# Altium footprint library capacitor_thd.PcbLib: 131 footprints (part 7 of 9)
Each footprint in its own frame and in the unit in brackets; x right, y up, seen from the top. Pads: shape width x height; smd on the part's side, far side on the other; paste and mask are expansions set on the pad; w line width, h text height; cw(c..) or ccw(c..) is an arc to the next point about the centre after c.
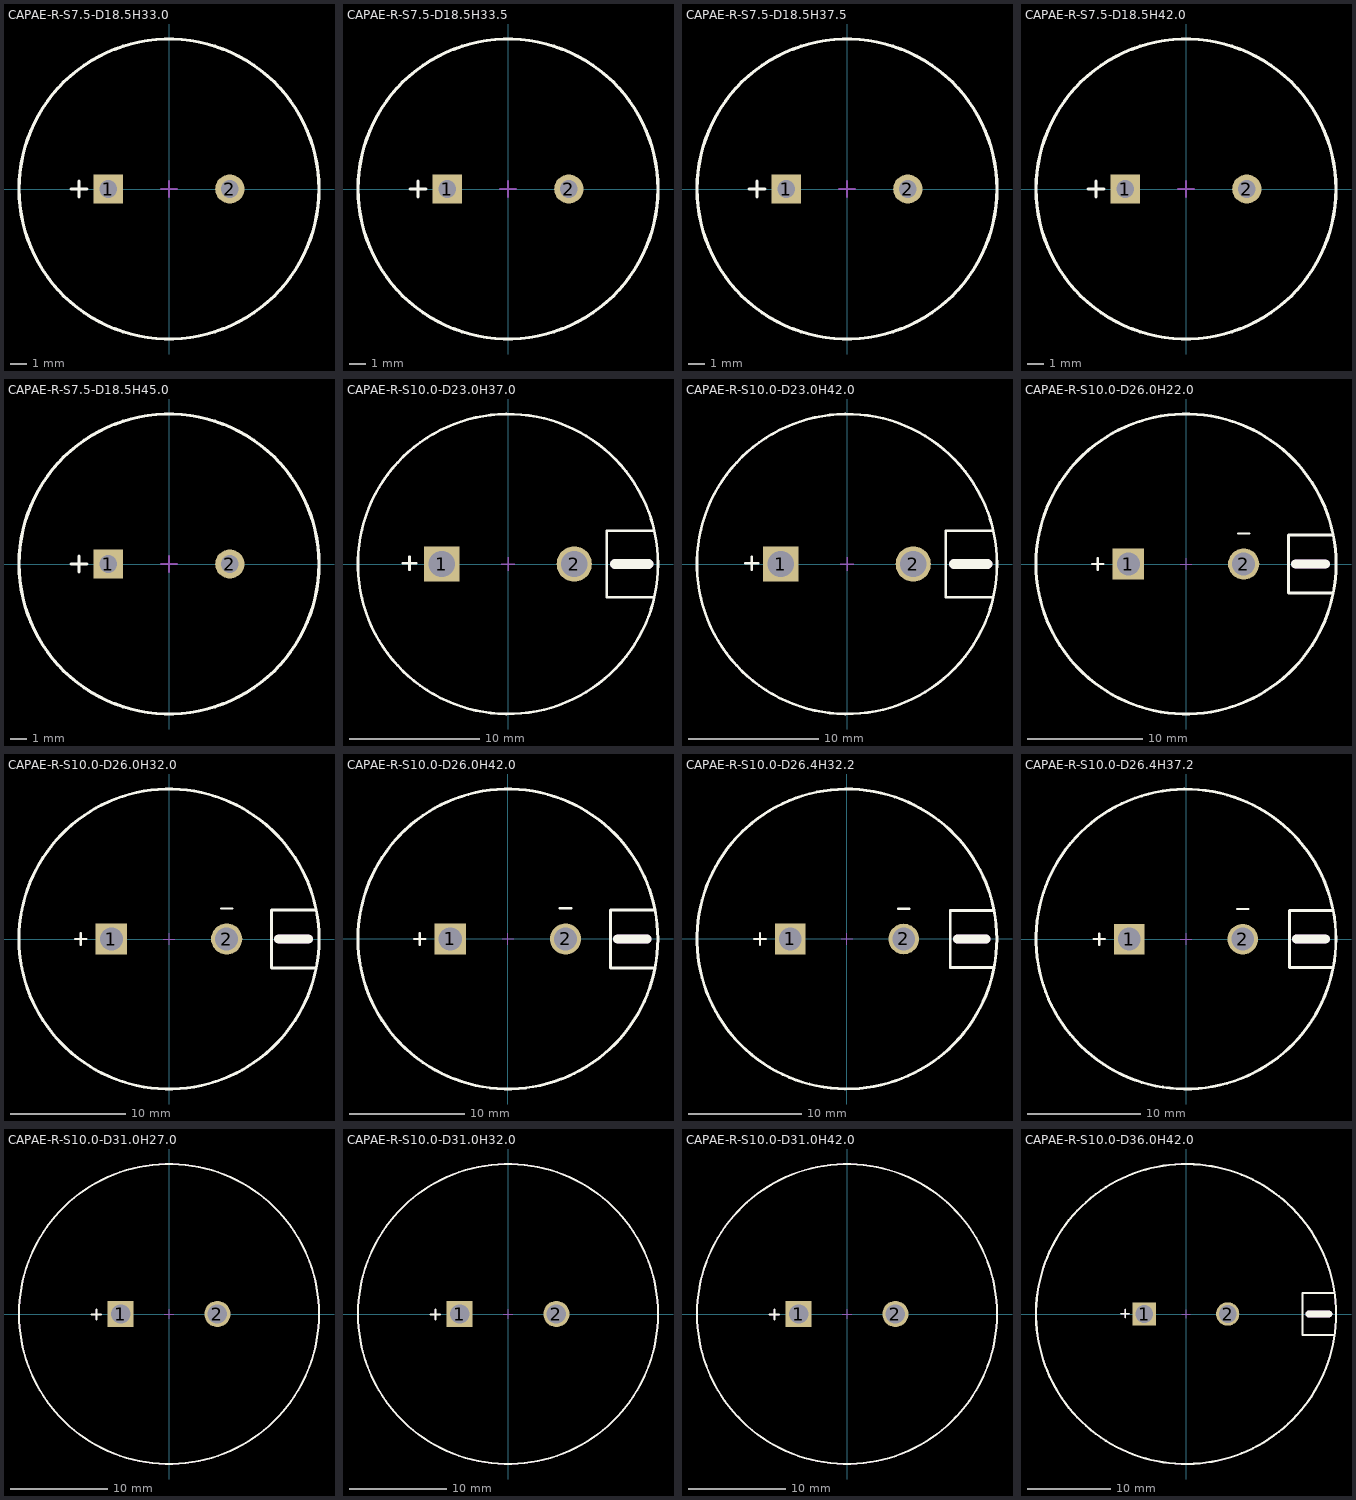
[diagram p6: the footprints below, top view; thin cyan lines are the x and y axes]

## CAPAE-R-S7.5-D18.5H33.0 [mm] "Capacitor, Radial, Pin spacing 7.5mm - Body Diameter 18.5mm X Body  Height 33.0mm"
height 33
pads (2):
  rect 1.8x1.8 hole 1.1: 1(-3.75,0)
  round 1.8 hole 1.1: 2(3.75,0)
Top Overlay:
  circle w0.2: c0,0 r9.25
  lines w0.2: -6.05,0 -5.05,0 ; -5.55,-0.5 -5.55,0.5
Mechanical 1:
  circle w0.1: c0,0 r9.25
  lines w0.1: -6.05,0 -5.05,0 ; -5.55,-0.5 -5.55,0.5
Mechanical 15:
  circle w0.1: c0,0 r9.25
  lines w0.1: -0.5,0 0.5,0 ; 0,-0.5 0,0.5
3D body "CAPPR750-1850X3300.stp": height 33, standoff -3.6, extent -9.25,-9.241 9.25,9.241

## CAPAE-R-S7.5-D18.5H33.5 [mm] "Capacitor, Radial, Pin spacing 7.5mm - Body Diameter 18.5mm X Body  Height 33.5mm"
height 33.5
pads (2):
  rect 1.8x1.8 hole 1.1: 1(-3.75,0)
  round 1.8 hole 1.1: 2(3.75,0)
Top Overlay:
  circle w0.2: c0,0 r9.25
  lines w0.2: -6.05,0 -5.05,0 ; -5.55,-0.5 -5.55,0.5
Mechanical 1:
  circle w0.1: c0,0 r9.25
  lines w0.1: -6.05,0 -5.05,0 ; -5.55,-0.5 -5.55,0.5
Mechanical 15:
  circle w0.1: c0,0 r9.25
  lines w0.1: -0.5,0 0.5,0 ; 0,-0.5 0,0.5
3D body "CAPPR750-1850X3350.stp": height 33.5, standoff -3.6, extent -9.25,-9.216 9.25,9.216

## CAPAE-R-S7.5-D18.5H37.5 [mm] "Capacitor, Radial, Pin spacing 7.5mm - Body Diameter 18.5mm X Body  Height 37.5mm"
height 37.5
pads (2):
  rect 1.8x1.8 hole 1.1: 1(-3.75,0)
  round 1.8 hole 1.1: 2(3.75,0)
Top Overlay:
  circle w0.2: c0,0 r9.25
  lines w0.2: -6.05,0 -5.05,0 ; -5.55,-0.5 -5.55,0.5
Mechanical 1:
  circle w0.1: c0,0 r9.25
  lines w0.1: -6.05,0 -5.05,0 ; -5.55,-0.5 -5.55,0.5
Mechanical 15:
  circle w0.1: c0,0 r9.25
  lines w0.1: -0.5,0 0.5,0 ; 0,-0.5 0,0.5
3D body "CAPPR750-1850X3750.stp": height 37.5, standoff -3.6, extent -9.25,-9.216 9.25,9.216

## CAPAE-R-S7.5-D18.5H42.0 [mm] "Capacitor, Radial, Pin spacing 7.5mm - Body Diameter 18.5mm X Body  Height 42mm"
height 42.5
pads (2):
  rect 1.8x1.8 hole 1.1: 1(-3.75,0)
  round 1.8 hole 1.1: 2(3.75,0)
Top Overlay:
  circle w0.2: c0,0 r9.25
  lines w0.2: -6.05,0 -5.05,0 ; -5.55,-0.5 -5.55,0.5
Mechanical 1:
  circle w0.1: c0,0 r9.25
  lines w0.1: -6.05,0 -5.05,0 ; -5.55,-0.5 -5.55,0.5
Mechanical 15:
  circle w0.1: c0,0 r9.25
  lines w0.1: -0.5,0 0.5,0 ; 0,-0.5 0,0.5
3D body "CAPPR750-1850X4200.stp": height 42, standoff -3.6, extent -9.25,-9.216 9.25,9.264

## CAPAE-R-S7.5-D18.5H45.0 [mm] "Capacitor, Radial, Pin spacing 7.5mm - Body Diameter 18.5mm X Body  Height 45mm"
height 46.5
pads (2):
  rect 1.8x1.8 hole 1.1: 1(-3.75,0)
  round 1.8 hole 1.1: 2(3.75,0)
Top Overlay:
  circle w0.2: c0,0 r9.25
  lines w0.2: -6.05,0 -5.05,0 ; -5.55,-0.5 -5.55,0.5
Mechanical 1:
  circle w0.1: c0,0 r9.25
  lines w0.1: -6.05,0 -5.05,0 ; -5.55,-0.5 -5.55,0.5
Mechanical 15:
  circle w0.1: c0,0 r9.25
  lines w0.1: -0.5,0 0.5,0 ; 0,-0.5 0,0.5
3D body "CAPPR750-1850X4650.stp": height 46.5, standoff -3.6, extent -9.25,-9.25 9.25,9.245

## CAPAE-R-S10.0-D23.0H37.0 [mm] "Capacitor, Radial, Pins spacing 10mm - Body Diameter 23mm X Body  Height 37mm"
height 37
pads (2):
  rect 2.7x2.7 hole 2: 1(-5.08,0)
  round 2.7 hole 2: 2(5.08,0)
Top Overlay:
  circle w0.2: c0,0 r11.5
  lines w0.2: -8.05,0.05 -7.05,0.05 ; -7.55,-0.45 -7.55,0.55 ; 11.131,-2.54 7.575,-2.54 7.575,2.54 11.131,2.54
  lines w0.8: 8.21,0 10.75,0
Mechanical 1:
  circle w0.1: c0,0 r11.5
  lines w0.1: -8.05,0.05 -7.05,0.05 ; -7.55,-0.45 -7.55,0.55 ; 11.131,-2.54 7.575,-2.54 7.575,2.54 11.131,2.54
  lines w0.8: 8.21,0 10.75,0
Mechanical 15:
  circle w0.1: c0,0 r11.5
  lines w0.1: -0.5,0 0.5,0 ; 0,-0.5 0,0.5
3D body "CAPPR1000-2300X3700.stp": height 37, standoff -4, extent -11.5,-11.5 11.5,11.5

## CAPAE-R-S10.0-D23.0H42.0 [mm] "Capacitor, Radial, Pins spacing 10mm - Body Diameter 23mm X Body  Height 42mm"
height 42
pads (2):
  rect 2.7x2.7 hole 2: 1(-5.08,0)
  round 2.7 hole 2: 2(5.08,0)
Top Overlay:
  circle w0.2: c0,0 r11.5
  lines w0.2: -7.8,0.05 -6.8,0.05 ; -7.3,-0.45 -7.3,0.55 ; 11.131,-2.54 7.575,-2.54 7.575,2.54 11.131,2.54
  lines w0.8: 8.21,0 10.75,0
Mechanical 1:
  circle w0.1: c0,0 r11.5
  lines w0.1: -7.8,0.05 -6.8,0.05 ; -7.3,-0.45 -7.3,0.55 ; 11.131,-2.54 7.575,-2.54 7.575,2.54 11.131,2.54
  lines w0.8: 8.21,0 10.75,0
Mechanical 15:
  circle w0.1: c0,0 r11.5
  lines w0.1: -0.5,0 0.5,0 ; 0,-0.5 0,0.5
3D body "CAPPR1000-2300X4200.stp": height 42, standoff -4, extent -11.5,-11.5 11.5,11.5

## CAPAE-R-S10.0-D26.0H22.0 [mm] "Capacitor, Radial, Pins spacing 10mm - Body Diameter 26.0mm X Body  Height 22.0mm"
height 22
pads (2):
  rect 2.7x2.7 hole 2: 1(-5,0)
  round 2.7 hole 2: 2(5,0)
Top Overlay:
  circle w0.254: c0,0 r13
  lines w0.2: -8.15,0 -7.15,0 ; -7.65,-0.5 -7.65,0.5 ; 4.5,2.65 5.5,2.65
  lines w0.254: 12.65,-2.5 8.9,-2.5 8.9,2.5 12.65,2.5
  lines w0.8: 9.519,0 10.154,0 11.424,0 12.059,0
Mechanical 1:
  circle w0.1: c0,0 r13
  lines w0.1: -8.15,0 -7.15,0 ; -7.65,-0.5 -7.65,0.5 ; 4.5,2.65 5.5,2.65 ; 12.65,-2.5 8.9,-2.5 8.9,2.5 12.65,2.5
  lines w0.8: 9.519,0 12.059,0
Mechanical 15:
  circle w0.1: c0,0 r13
  lines w0.1: -0.5,0 0.5,0 ; 0,-0.5 0,0.5
3D body "CAPPR1000-2600X2200.stp": height 22, standoff -4, extent -13,-13 13,13

## CAPAE-R-S10.0-D26.0H32.0 [mm] "Capacitor, Radial, Pins spacing 10mm - Body Diameter 26.0mm X Body  Height 32.0mm"
height 32
pads (2):
  rect 2.7x2.7 hole 2: 1(-5,0)
  round 2.7 hole 2: 2(5,0)
Top Overlay:
  circle w0.254: c0,0 r13
  lines w0.2: -8.15,0 -7.15,0 ; -7.65,-0.5 -7.65,0.5 ; 4.5,2.65 5.5,2.65
  lines w0.254: 12.65,-2.5 8.9,-2.5 8.9,2.5 12.65,2.5
  lines w0.8: 9.519,0 10.154,0 11.424,0 12.059,0
Mechanical 1:
  circle w0.1: c0,0 r13
  lines w0.1: -8.15,0 -7.15,0 ; -7.65,-0.5 -7.65,0.5 ; 4.5,2.65 5.5,2.65 ; 12.65,-2.5 8.9,-2.5 8.9,2.5 12.65,2.5
  lines w0.8: 9.519,0 12.059,0
Mechanical 15:
  circle w0.1: c0,0 r13
  lines w0.1: -0.5,0 0.5,0 ; 0,-0.5 0,0.5
3D body "CAPPR1000-2600X3200.stp": height 32, standoff -4, extent -13,-13 13,13

## CAPAE-R-S10.0-D26.0H42.0 [mm] "Capacitor, Radial, Pins spacing 10mm - Body Diameter 26.0mm X Body  Height 42.0mm"
height 42
pads (2):
  rect 2.7x2.7 hole 2: 1(-5,0)
  round 2.7 hole 2: 2(5,0)
Top Overlay:
  circle w0.254: c0,0 r13
  lines w0.2: -8.15,0 -7.15,0 ; -7.65,-0.5 -7.65,0.5 ; 4.5,2.65 5.5,2.65
  lines w0.254: 12.65,-2.5 8.9,-2.5 8.9,2.5 12.65,2.5
  lines w0.8: 9.519,0 10.154,0 11.424,0 12.059,0
Mechanical 1:
  circle w0.1: c0,0 r13
  lines w0.1: -8.15,0 -7.15,0 ; -7.65,-0.5 -7.65,0.5 ; 4.5,2.65 5.5,2.65 ; 12.65,-2.5 8.9,-2.5 8.9,2.5 12.65,2.5
  lines w0.8: 9.519,0 12.059,0
Mechanical 15:
  circle w0.1: c0.012,-0.008 r13
  lines w0.1: -0.5,0 0.5,0 ; 0,-0.5 0,0.5
3D body "CAPPR1000-2600X4200.stp": height 42, standoff -4, extent -13,-13 13,13

## CAPAE-R-S10.0-D26.4H32.2 [mm] "Capacitor, Radial, Pins spacing 10mm - Body Diameter 26.4.0mm X Body  Height 32.2mm"
height 32.2
pads (2):
  rect 2.7x2.7 hole 2: 1(-5,0)
  round 2.7 hole 2: 2(5,0)
Top Overlay:
  circle w0.254: c0,0 r13.2
  lines w0.2: -8.15,0 -7.15,0 ; -7.65,-0.5 -7.65,0.5 ; 4.5,2.65 5.5,2.65
  lines w0.254: 12.85,-2.5 9.1,-2.5 9.1,2.5 12.85,2.5
  lines w0.8: 9.719,0 10.354,0 11.624,0 12.259,0
Mechanical 1:
  circle w0.1: c0,0 r13.2
  lines w0.1: -8.15,0 -7.15,0 ; -7.65,-0.5 -7.65,0.5 ; 4.5,2.65 5.5,2.65 ; 12.85,-2.5 9.1,-2.5 9.1,2.5 12.85,2.5
  lines w0.8: 9.719,0 12.259,0
Mechanical 15:
  circle w0.1: c0.014,-0.003 r13.2
  lines w0.1: -0.5,0 0.5,0 ; 0,-0.5 0,0.5
3D body "CAPPR1000-2640X3220.stp": height 32.2, standoff -4, extent -13.2,-13.199 13.195,13.2

## CAPAE-R-S10.0-D26.4H37.2 [mm] "Capacitor, Radial, Pins spacing 10mm - Body Diameter 26.4.0mm X Body  Height 37.2mm"
height 37.2
pads (2):
  rect 2.7x2.7 hole 2: 1(-5,0)
  round 2.7 hole 2: 2(5,0)
Top Overlay:
  circle w0.254: c0,0 r13.2
  lines w0.2: -8.15,0 -7.15,0 ; -7.65,-0.5 -7.65,0.5 ; 4.5,2.65 5.5,2.65
  lines w0.254: 12.85,-2.5 9.1,-2.5 9.1,2.5 12.85,2.5
  lines w0.8: 9.719,0 10.354,0 11.624,0 12.259,0
Mechanical 1:
  circle w0.1: c0,0 r13.2
  lines w0.1: -8.15,0 -7.15,0 ; -7.65,-0.5 -7.65,0.5 ; 4.5,2.65 5.5,2.65 ; 12.85,-2.5 9.1,-2.5 9.1,2.5 12.85,2.5
  lines w0.8: 9.719,0 12.259,0
Mechanical 15:
  circle w0.1: c-0.002,0.015 r13.2
  lines w0.1: -0.5,0 0.5,0 ; 0,-0.5 0,0.5
3D body "CAPPR1000-2640X3720.stp": height 37.2, standoff -4, extent -13.169,-13.18 13.195,13.181

## CAPAE-R-S10.0-D31.0H27.0 [mm] "Capacitor, Radial, Pin spacing 10.0mm - Body Diameter 31.0mm X Body  Height 27.0mm"
height 27
pads (2):
  rect 2.7x2.7 hole 2: 1(-5,0)
  round 2.7 hole 2: 2(5,0)
Top Overlay:
  circle w0.2: c0,0 r15.5
  lines w0.2: -8,-0.05 -7,-0.05 ; -7.5,-0.55 -7.5,0.45
Mechanical 1:
  circle w0.1: c0,0 r15.5
  lines w0.1: -8,-0.05 -7,-0.05 ; -7.5,-0.55 -7.5,0.45
Mechanical 15:
  circle w0.1: c0,0 r15.5
  lines w0.1: -0.5,0 0.5,0 ; 0,-0.5 0,0.5
3D body "CAPPR1000-3100X27.stp": height 27, standoff -4, extent -15.5,-15.5 15.5,15.5

## CAPAE-R-S10.0-D31.0H32.0 [mm] "Capacitor, Radial, Pin spacing 10.0mm - Body Diameter 31.0mm X Body  Height 32.0mm"
height 32
pads (2):
  rect 2.7x2.7 hole 2: 1(-5,0)
  round 2.7 hole 2: 2(5,0)
Top Overlay:
  circle w0.2: c0,0 r15.5
  lines w0.2: -8,-0.05 -7,-0.05 ; -7.5,-0.55 -7.5,0.45
Mechanical 1:
  circle w0.1: c0,0 r15.5
  lines w0.1: -8,-0.05 -7,-0.05 ; -7.5,-0.55 -7.5,0.45
Mechanical 15:
  circle w0.1: c0,0 r15.5
  lines w0.1: -0.5,0 0.5,0 ; 0,-0.5 0,0.5
3D body "CAPPR1000-3100X3200.stp": height 32, standoff -4, extent -15.5,-15.457 15.5,15.457

## CAPAE-R-S10.0-D31.0H42.0 [mm] "Capacitor, Radial, Pin spacing 10.0mm - Body Diameter 31.0mm X Body  Height 42.0mm"
height 42
pads (2):
  rect 2.7x2.7 hole 2: 1(-5,0)
  round 2.7 hole 2: 2(5,0)
Top Overlay:
  circle w0.2: c0,0 r15.5
  lines w0.2: -8,-0.05 -7,-0.05 ; -7.5,-0.55 -7.5,0.45
Mechanical 1:
  circle w0.1: c0,0 r15.5
  lines w0.1: -8,-0.05 -7,-0.05 ; -7.5,-0.55 -7.5,0.45
Mechanical 15:
  circle w0.1: c0,0.006 r15.5
  lines w0.1: -0.5,0 0.5,0 ; 0,-0.5 0,0.5
3D body "CAPPR1000-3100X4200.stp": height 42, standoff -4, extent -15.5,-15.5 15.5,15.5

## CAPAE-R-S10.0-D36.0H42.0 [mm] "Capacitor, Radial, Leads spacing 10mm - Body Diameter 36.0mm X Body  Height 42.0mm"
height 42
pads (2):
  rect 2.8x2.8 hole 2.1: 1(-5,0)
  round 2.8 hole 2.1: 2(5,0)
Top Overlay:
  circle w0.254: c0,0 r18
  lines w0.2: -7.8,0.05 -6.8,0.05 ; -7.3,-0.45 -7.3,0.55
  lines w0.254: 17.75,-2.5 14,-2.5 14,2.5 17.75,2.5
  lines w0.8: 14.725,0 17.159,0
Mechanical 1:
  circle w0.1: c0,0 r18
  lines w0.1: -7.8,0.05 -6.8,0.05 ; -7.3,-0.45 -7.3,0.55 ; 17.75,-2.5 14,-2.5 14,2.5 17.75,2.5
  lines w0.8: 14.725,0 17.159,0
Mechanical 15:
  circle w0.1: c0,0 r18
  lines w0.1: -0.5,0 0.5,0 ; 0,-0.5 0,0.5
3D body "CAPPR1000-3600X4200.stp": height 42, standoff -4, extent -18,-17.985 18,17.985